# Altium schematic symbol library jlcpcb_2025_04_resistors_extended_2512.schlib: 2667 symbols (part 4 of 14) (continued)
## AC2512JK-0756KL
designator R?  Resistance: 56kΩ  (hidden comment: *)
Resistor, 56kΩ, ±5%, 1W, 200V, ±100ppm/℃, -55℃~+155℃, SMD 2512; Manufacturer: Uniroyal; Manufacturer Part Number: AC2512JK-0756KL; Supplier 1: LCSC; Supplier Part Number 1: C138220; JLCPCB Part Number: C138220; Power Rating: 1W; Category: Resistors; Package Size: 2512; JLCPCB Basic Part: Yes; Tolerance: ±5%; Voltage Rating: 200V; Temperature Coefficient: ±100ppm/℃; Temperature Rating: -55℃~+155℃; ComponentLink1Description: Datasheet; ComponentLink1URL: https://wmsc.lcsc.com/wmsc/upload/file/pdf/v2/lcsc/2304140030_YAGEO-AC2512JK-0756KL_C138220.pdf; ComponentLink2Description: JLCPCB Part URL; ComponentLink2URL: https://jlcpcb.com/partdetail/C138220
pins: 1, 2
1 alternate drawing of the same symbol

## AC2512JK-0768RL
designator R?  Resistance: 68Ω  (hidden comment: *)
Resistor, 68Ω, ±5%, 1W, 200V, ±100ppm/℃, -55℃~+155℃, SMD 2512; Manufacturer: Uniroyal; Manufacturer Part Number: AC2512JK-0768RL; Supplier 1: LCSC; Supplier Part Number 1: C231054; JLCPCB Part Number: C231054; Power Rating: 1W; Category: Resistors; Package Size: 2512; JLCPCB Basic Part: Yes; Tolerance: ±5%; Voltage Rating: 200V; Temperature Coefficient: ±100ppm/℃; Temperature Rating: -55℃~+155℃; ComponentLink1Description: Datasheet; ComponentLink1URL: https://wmsc.lcsc.com/wmsc/upload/file/pdf/v2/lcsc/2112131730_YAGEO-AC2512JK-0768RL_C231054.pdf; ComponentLink2Description: JLCPCB Part URL; ComponentLink2URL: https://jlcpcb.com/partdetail/C231054
pins: 1, 2
1 alternate drawing of the same symbol

## AC2512JK-07100KL
designator R?  Resistance: 100kΩ  (hidden comment: *)
Resistor, 100kΩ, ±5%, 1W, 200V, ±100ppm/℃, -55℃~+155℃, SMD 2512; Manufacturer: Uniroyal; Manufacturer Part Number: AC2512JK-07100KL; Supplier 1: LCSC; Supplier Part Number 1: C230951; JLCPCB Part Number: C230951; Power Rating: 1W; Category: Resistors; Package Size: 2512; JLCPCB Basic Part: Yes; Tolerance: ±5%; Voltage Rating: 200V; Temperature Coefficient: ±100ppm/℃; Temperature Rating: -55℃~+155℃; ComponentLink1Description: Datasheet; ComponentLink1URL: https://wmsc.lcsc.com/wmsc/upload/file/pdf/v2/lcsc/2112131730_YAGEO-AC2512JK-07100KL_C230951.pdf; ComponentLink2Description: JLCPCB Part URL; ComponentLink2URL: https://jlcpcb.com/partdetail/C230951
pins: 1, 2
1 alternate drawing of the same symbol

## AC2512JK-07100RL
designator R?  Resistance: 100Ω  (hidden comment: *)
Resistor, 100Ω, ±5%, 1W, 200V, ±100ppm/℃, -55℃~+155℃, SMD 2512; Manufacturer: Uniroyal; Manufacturer Part Number: AC2512JK-07100RL; Supplier 1: LCSC; Supplier Part Number 1: C230952; JLCPCB Part Number: C230952; Power Rating: 1W; Category: Resistors; Package Size: 2512; JLCPCB Basic Part: Yes; Tolerance: ±5%; Voltage Rating: 200V; Temperature Coefficient: ±100ppm/℃; Temperature Rating: -55℃~+155℃; ComponentLink1Description: Datasheet; ComponentLink1URL: https://wmsc.lcsc.com/wmsc/upload/file/pdf/v2/lcsc/2112131730_YAGEO-AC2512JK-07100RL_C230952.pdf; ComponentLink2Description: JLCPCB Part URL; ComponentLink2URL: https://jlcpcb.com/partdetail/C230952
pins: 1, 2
1 alternate drawing of the same symbol

## AC2512JK-07130RL
designator R?  Resistance: 130Ω  (hidden comment: *)
Resistor, 130Ω, ±5%, 1W, ±100ppm/℃, -55℃~+155℃, SMD 2512; Manufacturer: Uniroyal; Manufacturer Part Number: AC2512JK-07130RL; Supplier 1: LCSC; Supplier Part Number 1: C230964; JLCPCB Part Number: C230964; Power Rating: 1W; Category: Resistors; Package Size: 2512; JLCPCB Basic Part: Yes; Tolerance: ±5%; Temperature Coefficient: ±100ppm/℃; Temperature Rating: -55℃~+155℃; ComponentLink1Description: Datasheet; ComponentLink1URL: https://wmsc.lcsc.com/wmsc/upload/file/pdf/v2/lcsc/2111101730_YAGEO-AC2512JK-07130RL_C230964.pdf; ComponentLink2Description: JLCPCB Part URL; ComponentLink2URL: https://jlcpcb.com/partdetail/C230964
pins: 1, 2
1 alternate drawing of the same symbol

## AC2512JK-07150RL
designator R?  Resistance: 150Ω  (hidden comment: *)
Resistor, 150Ω, ±5%, 1W, 200V, ±100ppm/℃, -55℃~+155℃, SMD 2512; Manufacturer: Uniroyal; Manufacturer Part Number: AC2512JK-07150RL; Supplier 1: LCSC; Supplier Part Number 1: C230968; JLCPCB Part Number: C230968; Power Rating: 1W; Category: Resistors; Package Size: 2512; JLCPCB Basic Part: Yes; Tolerance: ±5%; Voltage Rating: 200V; Temperature Coefficient: ±100ppm/℃; Temperature Rating: -55℃~+155℃; ComponentLink1Description: Datasheet; ComponentLink1URL: https://wmsc.lcsc.com/wmsc/upload/file/pdf/v2/lcsc/2111241830_YAGEO-AC2512JK-07150RL_C230968.pdf; ComponentLink2Description: JLCPCB Part URL; ComponentLink2URL: https://jlcpcb.com/partdetail/C230968
pins: 1, 2
1 alternate drawing of the same symbol

## AC2512JK-07160RL
designator R?  Resistance: 160Ω  (hidden comment: *)
Resistor, 160Ω, ±5%, 1W, ±100ppm/℃, -55℃~+155℃, SMD 2512; Manufacturer: Uniroyal; Manufacturer Part Number: AC2512JK-07160RL; Supplier 1: LCSC; Supplier Part Number 1: C230971; JLCPCB Part Number: C230971; Power Rating: 1W; Category: Resistors; Package Size: 2512; JLCPCB Basic Part: Yes; Tolerance: ±5%; Temperature Coefficient: ±100ppm/℃; Temperature Rating: -55℃~+155℃; ComponentLink1Description: Datasheet; ComponentLink1URL: https://wmsc.lcsc.com/wmsc/upload/file/pdf/v2/lcsc/2112291730_YAGEO-AC2512JK-07160RL_C230971.pdf; ComponentLink2Description: JLCPCB Part URL; ComponentLink2URL: https://jlcpcb.com/partdetail/C230971
pins: 1, 2
1 alternate drawing of the same symbol

## AC2512JK-07200RL
designator R?  Resistance: 200Ω  (hidden comment: *)
Resistor, 200Ω, ±5%, 1W, ±100ppm/℃, -55℃~+155℃, SMD 2512; Manufacturer: Uniroyal; Manufacturer Part Number: AC2512JK-07200RL; Supplier 1: LCSC; Supplier Part Number 1: C230993; JLCPCB Part Number: C230993; Power Rating: 1W; Category: Resistors; Package Size: 2512; JLCPCB Basic Part: Yes; Tolerance: ±5%; Temperature Coefficient: ±100ppm/℃; Temperature Rating: -55℃~+155℃; ComponentLink1Description: Datasheet; ComponentLink1URL: https://wmsc.lcsc.com/wmsc/upload/file/pdf/v2/lcsc/2112171030_YAGEO-AC2512JK-07200RL_C230993.pdf; ComponentLink2Description: JLCPCB Part URL; ComponentLink2URL: https://jlcpcb.com/partdetail/C230993
pins: 1, 2
1 alternate drawing of the same symbol

## AC2512JK-07300KL
designator R?  Resistance: 300kΩ  (hidden comment: *)
Resistor, 300kΩ, ±5%, 1W, ±100ppm/℃, -55℃~+155℃, SMD 2512; Manufacturer: Uniroyal; Manufacturer Part Number: AC2512JK-07300KL; Supplier 1: LCSC; Supplier Part Number 1: C231012; JLCPCB Part Number: C231012; Power Rating: 1W; Category: Resistors; Package Size: 2512; JLCPCB Basic Part: Yes; Tolerance: ±5%; Temperature Coefficient: ±100ppm/℃; Temperature Rating: -55℃~+155℃; ComponentLink1Description: Datasheet; ComponentLink1URL: https://wmsc.lcsc.com/wmsc/upload/file/pdf/v2/lcsc/2204251545_YAGEO-AC2512JK-07300KL_C231012.pdf; ComponentLink2Description: JLCPCB Part URL; ComponentLink2URL: https://jlcpcb.com/partdetail/C231012
pins: 1, 2
1 alternate drawing of the same symbol

## AC2512JK-07300RL
designator R?  Resistance: 300Ω  (hidden comment: *)
Resistor, 300Ω, ±5%, 1W, 200V, ±100ppm/℃, -55℃~+155℃, SMD 2512; Manufacturer: Uniroyal; Manufacturer Part Number: AC2512JK-07300RL; Supplier 1: LCSC; Supplier Part Number 1: C231013; JLCPCB Part Number: C231013; Power Rating: 1W; Category: Resistors; Package Size: 2512; JLCPCB Basic Part: Yes; Tolerance: ±5%; Voltage Rating: 200V; Temperature Coefficient: ±100ppm/℃; Temperature Rating: -55℃~+155℃; ComponentLink1Description: Datasheet; ComponentLink1URL: https://wmsc.lcsc.com/wmsc/upload/file/pdf/v2/lcsc/2202211530_YAGEO-AC2512JK-07300RL_C231013.pdf; ComponentLink2Description: JLCPCB Part URL; ComponentLink2URL: https://jlcpcb.com/partdetail/C231013
pins: 1, 2
1 alternate drawing of the same symbol

## AC2512JK-07330RL
designator R?  Resistance: 330Ω  (hidden comment: *)
Resistor, 330Ω, ±5%, 1W, 200V, ±100ppm/℃, -55℃~+155℃, SMD 2512; Manufacturer: Uniroyal; Manufacturer Part Number: AC2512JK-07330RL; Supplier 1: LCSC; Supplier Part Number 1: C144426; JLCPCB Part Number: C144426; Power Rating: 1W; Category: Resistors; Package Size: 2512; JLCPCB Basic Part: Yes; Tolerance: ±5%; Voltage Rating: 200V; Temperature Coefficient: ±100ppm/℃; Temperature Rating: -55℃~+155℃; ComponentLink1Description: Datasheet; ComponentLink1URL: https://wmsc.lcsc.com/wmsc/upload/file/pdf/v2/lcsc/2304140030_YAGEO-AC2512JK-07330RL_C144426.pdf; ComponentLink2Description: JLCPCB Part URL; ComponentLink2URL: https://jlcpcb.com/partdetail/C144426
pins: 1, 2
1 alternate drawing of the same symbol

## AECR2512F1K00K9
designator R?  Resistance: 1kΩ  (hidden comment: *)
Resistor, 1kΩ, ±1%, 1W, 200V, ±100ppm/℃, -55℃~+125℃, SMD 2512; Manufacturer: Uniroyal; Manufacturer Part Number: AECR2512F1K00K9; Supplier 1: LCSC; Supplier Part Number 1: C328413; JLCPCB Part Number: C328413; Power Rating: 1W; Category: Resistors; Package Size: 2512; JLCPCB Basic Part: Yes; Tolerance: ±1%; Voltage Rating: 200V; Temperature Coefficient: ±100ppm/℃; Temperature Rating: -55℃~+125℃; ComponentLink1Description: Datasheet; ComponentLink1URL: https://wmsc.lcsc.com/wmsc/upload/file/pdf/v2/lcsc/2304140030_RESI-AECR2512F1K00K9_C328413.pdf; ComponentLink2Description: JLCPCB Part URL; ComponentLink2URL: https://jlcpcb.com/partdetail/C328413
pins: 1, 2
1 alternate drawing of the same symbol

## AECR2512F1R00T9
designator R?  Resistance: 1Ω  (hidden comment: *)
Resistor, 1Ω, ±1%, 1W, 200V, ±250ppm/℃, -55℃~+125℃, SMD 2512; Manufacturer: Uniroyal; Manufacturer Part Number: AECR2512F1R00T9; Supplier 1: LCSC; Supplier Part Number 1: C328414; JLCPCB Part Number: C328414; Power Rating: 1W; Category: Resistors; Package Size: 2512; JLCPCB Basic Part: Yes; Tolerance: ±1%; Voltage Rating: 200V; Temperature Coefficient: ±250ppm/℃; Temperature Rating: -55℃~+125℃; ComponentLink1Description: Datasheet; ComponentLink1URL: https://wmsc.lcsc.com/wmsc/upload/file/pdf/v2/lcsc/2304140030_RESI-AECR2512F1R00T9_C328414.pdf; ComponentLink2Description: JLCPCB Part URL; ComponentLink2URL: https://jlcpcb.com/partdetail/C328414
pins: 1, 2
1 alternate drawing of the same symbol

## AECR2512F2R00S9
designator R?  Resistance: 2Ω  (hidden comment: *)
Resistor, 2Ω, ±1%, 1W, ±250ppm/℃, SMD 2512; Manufacturer: Uniroyal; Manufacturer Part Number: AECR2512F2R00S9; Supplier 1: LCSC; Supplier Part Number 1: C2849033; JLCPCB Part Number: C2849033; Power Rating: 1W; Category: Resistors; Package Size: 2512; JLCPCB Basic Part: Yes; Tolerance: ±1%; Temperature Coefficient: ±250ppm/℃; ComponentLink1Description: Datasheet; ComponentLink1URL: https://wmsc.lcsc.com/wmsc/upload/file/pdf/v2/lcsc/2311171200_RESI-AECR2512F2R00S9_C2849033.pdf; ComponentLink2Description: JLCPCB Part URL; ComponentLink2URL: https://jlcpcb.com/partdetail/C2849033
pins: 1, 2
1 alternate drawing of the same symbol

## AECR2512F10R0K9
designator R?  Resistance: 10Ω  (hidden comment: *)
Resistor, 10Ω, ±1%, 1W, 200V, ±100ppm/℃, -55℃~+125℃, SMD 2512; Manufacturer: Uniroyal; Manufacturer Part Number: AECR2512F10R0K9; Supplier 1: LCSC; Supplier Part Number 1: C328412; JLCPCB Part Number: C328412; Power Rating: 1W; Category: Resistors; Package Size: 2512; JLCPCB Basic Part: Yes; Tolerance: ±1%; Voltage Rating: 200V; Temperature Coefficient: ±100ppm/℃; Temperature Rating: -55℃~+125℃; ComponentLink1Description: Datasheet; ComponentLink1URL: https://wmsc.lcsc.com/wmsc/upload/file/pdf/v2/lcsc/2304140030_RESI-AECR2512F10R0K9_C328412.pdf; ComponentLink2Description: JLCPCB Part URL; ComponentLink2URL: https://jlcpcb.com/partdetail/C328412
pins: 1, 2
1 alternate drawing of the same symbol

## AECR2512F100KK9
designator R?  Resistance: 100kΩ  (hidden comment: *)
Resistor, 100kΩ, ±1%, 1W, 200V, ±100ppm/℃, -55℃~+125℃, SMD 2512; Manufacturer: Uniroyal; Manufacturer Part Number: AECR2512F100KK9; Supplier 1: LCSC; Supplier Part Number 1: C351749; JLCPCB Part Number: C351749; Power Rating: 1W; Category: Resistors; Package Size: 2512; JLCPCB Basic Part: Yes; Tolerance: ±1%; Voltage Rating: 200V; Temperature Coefficient: ±100ppm/℃; Temperature Rating: -55℃~+125℃; ComponentLink1Description: Datasheet; ComponentLink1URL: https://wmsc.lcsc.com/wmsc/upload/file/pdf/v2/lcsc/2304140030_RESI-AECR2512F100KK9_C351749.pdf; ComponentLink2Description: JLCPCB Part URL; ComponentLink2URL: https://jlcpcb.com/partdetail/C351749
pins: 1, 2
1 alternate drawing of the same symbol

## AECR2512F100RK9
designator R?  Resistance: 100Ω  (hidden comment: *)
Resistor, 100Ω, ±1%, 1W, 200V, ±100ppm/℃, -55℃~+125℃, SMD 2512; Manufacturer: Uniroyal; Manufacturer Part Number: AECR2512F100RK9; Supplier 1: LCSC; Supplier Part Number 1: C328411; JLCPCB Part Number: C328411; Power Rating: 1W; Category: Resistors; Package Size: 2512; JLCPCB Basic Part: Yes; Tolerance: ±1%; Voltage Rating: 200V; Temperature Coefficient: ±100ppm/℃; Temperature Rating: -55℃~+125℃; ComponentLink1Description: Datasheet; ComponentLink1URL: https://wmsc.lcsc.com/wmsc/upload/file/pdf/v2/lcsc/2304140030_RESI-AECR2512F100RK9_C328411.pdf; ComponentLink2Description: JLCPCB Part URL; ComponentLink2URL: https://jlcpcb.com/partdetail/C328411
pins: 1, 2
1 alternate drawing of the same symbol

## AECR2512F200KK9
designator R?  Resistance: 200kΩ  (hidden comment: *)
Resistor, 200kΩ, ±1%, 1W, 200V, ±100ppm/℃, -55℃~+125℃, SMD 2512; Manufacturer: Uniroyal; Manufacturer Part Number: AECR2512F200KK9; Supplier 1: LCSC; Supplier Part Number 1: C351739; JLCPCB Part Number: C351739; Power Rating: 1W; Category: Resistors; Package Size: 2512; JLCPCB Basic Part: Yes; Tolerance: ±1%; Voltage Rating: 200V; Temperature Coefficient: ±100ppm/℃; Temperature Rating: -55℃~+125℃; ComponentLink1Description: Datasheet; ComponentLink1URL: https://wmsc.lcsc.com/wmsc/upload/file/pdf/v2/lcsc/2304140030_RESI-AECR2512F200KK9_C351739.pdf; ComponentLink2Description: JLCPCB Part URL; ComponentLink2URL: https://jlcpcb.com/partdetail/C351739
pins: 1, 2
1 alternate drawing of the same symbol

## AR12DTD2493
designator R?  Resistance: 249kΩ  (hidden comment: *)
Resistor, 249kΩ, ±0.5%, ±50ppm/℃, SMD 2512; Manufacturer: Uniroyal; Manufacturer Part Number: AR12DTD2493; Supplier 1: LCSC; Supplier Part Number 1: C3015195; JLCPCB Part Number: C3015195; Category: Resistors; Package Size: 2512; JLCPCB Basic Part: Yes; Tolerance: ±0.5%; Temperature Coefficient: ±50ppm/℃; ComponentLink1Description: Datasheet; ComponentLink1URL: https://wmsc.lcsc.com/wmsc/upload/file/pdf/v2/lcsc/2205121730_Viking-Tech-AR12DTD2493_C3015195.pdf; ComponentLink2Description: JLCPCB Part URL; ComponentLink2URL: https://jlcpcb.com/partdetail/C3015195
pins: 1, 2
1 alternate drawing of the same symbol

## AS122WJ0101T4E
designator R?  Resistance: 100Ω  (hidden comment: *)
Resistor, 100Ω, ±5%, 2W, 500V, -55℃~+155℃, SMD 2512; Manufacturer: Uniroyal; Manufacturer Part Number: AS122WJ0101T4E; Supplier 1: LCSC; Supplier Part Number 1: C2765606; JLCPCB Part Number: C2765606; Power Rating: 2W; Category: Resistors; Package Size: 2512; JLCPCB Basic Part: Yes; Tolerance: ±5%; Voltage Rating: 500V; Temperature Rating: -55℃~+155℃; ComponentLink1Description: Datasheet; ComponentLink1URL: https://wmsc.lcsc.com/wmsc/upload/file/pdf/v2/lcsc/2304140030_UNI-ROYAL-Uniroyal-Elec-AS122WJ0101T4E_C2765606.pdf; ComponentLink2Description: JLCPCB Part URL; ComponentLink2URL: https://jlcpcb.com/partdetail/C2765606
pins: 1, 2
1 alternate drawing of the same symbol

## AS122WJ0201T4E
designator R?  Resistance: 200Ω  (hidden comment: *)
Resistor, 200Ω, ±5%, 2W, 500V, -55℃~+155℃, SMD 2512; Manufacturer: Uniroyal; Manufacturer Part Number: AS122WJ0201T4E; Supplier 1: LCSC; Supplier Part Number 1: C2770484; JLCPCB Part Number: C2770484; Power Rating: 2W; Category: Resistors; Package Size: 2512; JLCPCB Basic Part: Yes; Tolerance: ±5%; Voltage Rating: 500V; Temperature Rating: -55℃~+155℃; ComponentLink1Description: Datasheet; ComponentLink1URL: https://wmsc.lcsc.com/wmsc/upload/file/pdf/v2/lcsc/2304140030_UNI-ROYAL-Uniroyal-Elec-AS122WJ0201T4E_C2770484.pdf; ComponentLink2Description: JLCPCB Part URL; ComponentLink2URL: https://jlcpcb.com/partdetail/C2770484
pins: 1, 2
1 alternate drawing of the same symbol

## AS122WJ0221T4E
designator R?  Resistance: 220Ω  (hidden comment: *)
Resistor, 220Ω, ±5%, 2W, 500V, -55℃~+155℃, SMD 2512; Manufacturer: Uniroyal; Manufacturer Part Number: AS122WJ0221T4E; Supplier 1: LCSC; Supplier Part Number 1: C965941; JLCPCB Part Number: C965941; Power Rating: 2W; Category: Resistors; Package Size: 2512; JLCPCB Basic Part: Yes; Tolerance: ±5%; Voltage Rating: 500V; Temperature Rating: -55℃~+155℃; ComponentLink1Description: Datasheet; ComponentLink1URL: https://wmsc.lcsc.com/wmsc/upload/file/pdf/v2/lcsc/2304140030_UNI-ROYAL-Uniroyal-Elec-AS122WJ0221T4E_C965941.pdf; ComponentLink2Description: JLCPCB Part URL; ComponentLink2URL: https://jlcpcb.com/partdetail/C965941
pins: 1, 2
1 alternate drawing of the same symbol

## AS122WJ0470T4E
designator R?  Resistance: 47Ω  (hidden comment: *)
Resistor, 47Ω, ±5%, 2W, 500V, ±100ppm/℃, -55℃~+155℃, SMD 2512; Manufacturer: Uniroyal; Manufacturer Part Number: AS122WJ0470T4E; Supplier 1: LCSC; Supplier Part Number 1: C2765607; JLCPCB Part Number: C2765607; Power Rating: 2W; Category: Resistors; Package Size: 2512; JLCPCB Basic Part: Yes; Tolerance: ±5%; Voltage Rating: 500V; Temperature Coefficient: ±100ppm/℃; Temperature Rating: -55℃~+155℃; ComponentLink1Description: Datasheet; ComponentLink1URL: https://wmsc.lcsc.com/wmsc/upload/file/pdf/v2/lcsc/2304140030_UNI-ROYAL-Uniroyal-Elec-AS122WJ0470T4E_C2765607.pdf; ComponentLink2Description: JLCPCB Part URL; ComponentLink2URL: https://jlcpcb.com/partdetail/C2765607
pins: 1, 2
1 alternate drawing of the same symbol

## AS122WJ0511T4E
designator R?  Resistance: 510Ω  (hidden comment: *)
Resistor, 510Ω, ±5%, 2W, 500V, ±100ppm/℃, -55℃~+155℃, SMD 2512; Manufacturer: Uniroyal; Manufacturer Part Number: AS122WJ0511T4E; Supplier 1: LCSC; Supplier Part Number 1: C2765608; JLCPCB Part Number: C2765608; Power Rating: 2W; Category: Resistors; Package Size: 2512; JLCPCB Basic Part: Yes; Tolerance: ±5%; Voltage Rating: 500V; Temperature Coefficient: ±100ppm/℃; Temperature Rating: -55℃~+155℃; ComponentLink1Description: Datasheet; ComponentLink1URL: https://wmsc.lcsc.com/wmsc/upload/file/pdf/v2/lcsc/2304140030_UNI-ROYAL-Uniroyal-Elec-AS122WJ0511T4E_C2765608.pdf; ComponentLink2Description: JLCPCB Part URL; ComponentLink2URL: https://jlcpcb.com/partdetail/C2765608
pins: 1, 2
1 alternate drawing of the same symbol

## AS2512J2K00E04Z
designator R?  Resistance: 2kΩ  (hidden comment: *)
Resistor, 2kΩ, ±10%, 1.5W, ±150ppm/℃, SMD 2512; Manufacturer: Uniroyal; Manufacturer Part Number: AS2512J2K00E04Z; Supplier 1: LCSC; Supplier Part Number 1: C881282; JLCPCB Part Number: C881282; Power Rating: 1.5W; Category: Resistors; Package Size: 2512; JLCPCB Basic Part: Yes; Tolerance: ±10%; Temperature Coefficient: ±150ppm/℃; ComponentLink1Description: Datasheet; ComponentLink1URL: https://wmsc.lcsc.com/wmsc/upload/file/pdf/v2/lcsc/2010191906_Ever-Ohms-Tech-AS2512J2K00E04Z_C881282.pdf; ComponentLink2Description: JLCPCB Part URL; ComponentLink2URL: https://jlcpcb.com/partdetail/C881282
pins: 1, 2
1 alternate drawing of the same symbol

## CQ121WF100KT4E
designator R?  Resistance: 1Ω  (hidden comment: *)
Resistor, 1Ω, ±1%, 1W, 200V, ±200ppm/℃, -55℃~+155℃, SMD 2512; Manufacturer: Uniroyal; Manufacturer Part Number: CQ121WF100KT4E; Supplier 1: LCSC; Supplier Part Number 1: C2771582; JLCPCB Part Number: C2771582; Power Rating: 1W; Category: Resistors; Package Size: 2512; JLCPCB Basic Part: Yes; Tolerance: ±1%; Voltage Rating: 200V; Temperature Coefficient: ±200ppm/℃; Temperature Rating: -55℃~+155℃; ComponentLink1Description: Datasheet; ComponentLink1URL: https://wmsc.lcsc.com/wmsc/upload/file/pdf/v2/lcsc/2304140030_UNI-ROYAL-Uniroyal-Elec-CQ121WF100KT4E_C2771582.pdf; ComponentLink2Description: JLCPCB Part URL; ComponentLink2URL: https://jlcpcb.com/partdetail/C2771582
pins: 1, 2
1 alternate drawing of the same symbol

## CQ121WF330JT4E
designator R?  Resistance: 33Ω  (hidden comment: *)
Resistor, 33Ω, ±1%, 1W, ±100ppm/℃, SMD 2512; Manufacturer: Uniroyal; Manufacturer Part Number: CQ121WF330JT4E; Supplier 1: LCSC; Supplier Part Number 1: C966236; JLCPCB Part Number: C966236; Power Rating: 1W; Category: Resistors; Package Size: 2512; JLCPCB Basic Part: Yes; Tolerance: ±1%; Temperature Coefficient: ±100ppm/℃; ComponentLink1Description: Datasheet; ComponentLink1URL: https://wmsc.lcsc.com/wmsc/upload/file/pdf/v2/lcsc/2304140030_UNI-ROYAL-Uniroyal-Elec-CQ121WF330JT4E_C966236.pdf; ComponentLink2Description: JLCPCB Part URL; ComponentLink2URL: https://jlcpcb.com/partdetail/C966236
pins: 1, 2
1 alternate drawing of the same symbol

## CQ121WF560JT4E
designator R?  Resistance: 56Ω  (hidden comment: *)
Resistor, 56Ω, ±1%, 1W, ±100ppm/℃, SMD 2512; Manufacturer: Uniroyal; Manufacturer Part Number: CQ121WF560JT4E; Supplier 1: LCSC; Supplier Part Number 1: C966232; JLCPCB Part Number: C966232; Power Rating: 1W; Category: Resistors; Package Size: 2512; JLCPCB Basic Part: Yes; Tolerance: ±1%; Temperature Coefficient: ±100ppm/℃; ComponentLink1Description: Datasheet; ComponentLink1URL: https://wmsc.lcsc.com/wmsc/upload/file/pdf/v2/lcsc/2304140030_UNI-ROYAL-Uniroyal-Elec-CQ121WF560JT4E_C966232.pdf; ComponentLink2Description: JLCPCB Part URL; ComponentLink2URL: https://jlcpcb.com/partdetail/C966232
pins: 1, 2
1 alternate drawing of the same symbol

## CQ121WF750JT4E
designator R?  Resistance: 75Ω  (hidden comment: *)
Resistor, 75Ω, ±1%, 1W, 200V, ±100ppm/℃, -55℃~+155℃, SMD 2512; Manufacturer: Uniroyal; Manufacturer Part Number: CQ121WF750JT4E; Supplier 1: LCSC; Supplier Part Number 1: C2759538; JLCPCB Part Number: C2759538; Power Rating: 1W; Category: Resistors; Package Size: 2512; JLCPCB Basic Part: Yes; Tolerance: ±1%; Voltage Rating: 200V; Temperature Coefficient: ±100ppm/℃; Temperature Rating: -55℃~+155℃; ComponentLink1Description: Datasheet; ComponentLink1URL: https://wmsc.lcsc.com/wmsc/upload/file/pdf/v2/lcsc/2304140030_UNI-ROYAL-Uniroyal-Elec-CQ121WF750JT4E_C2759538.pdf; ComponentLink2Description: JLCPCB Part URL; ComponentLink2URL: https://jlcpcb.com/partdetail/C2759538
pins: 1, 2
1 alternate drawing of the same symbol

## CQ121WF1000T4E
designator R?  Resistance: 100Ω  (hidden comment: *)
Resistor, 100Ω, ±1%, 1W, 200V, -55℃~+155℃, SMD 2512; Manufacturer: Uniroyal; Manufacturer Part Number: CQ121WF1000T4E; Supplier 1: LCSC; Supplier Part Number 1: C2771577; JLCPCB Part Number: C2771577; Power Rating: 1W; Category: Resistors; Package Size: 2512; JLCPCB Basic Part: Yes; Tolerance: ±1%; Voltage Rating: 200V; Temperature Rating: -55℃~+155℃; ComponentLink1Description: Datasheet; ComponentLink1URL: https://wmsc.lcsc.com/wmsc/upload/file/pdf/v2/lcsc/2304140030_UNI-ROYAL-Uniroyal-Elec-CQ121WF1000T4E_C2771577.pdf; ComponentLink2Description: JLCPCB Part URL; ComponentLink2URL: https://jlcpcb.com/partdetail/C2771577
pins: 1, 2
1 alternate drawing of the same symbol

## CQ121WF1301T4E
designator R?  Resistance: 1.3kΩ  (hidden comment: *)
Resistor, 1.3kΩ, ±1%, 1W, ±100ppm/℃, SMD 2512; Manufacturer: Uniroyal; Manufacturer Part Number: CQ121WF1301T4E; Supplier 1: LCSC; Supplier Part Number 1: C966246; JLCPCB Part Number: C966246; Power Rating: 1W; Category: Resistors; Package Size: 2512; JLCPCB Basic Part: Yes; Tolerance: ±1%; Temperature Coefficient: ±100ppm/℃; ComponentLink1Description: Datasheet; ComponentLink1URL: https://wmsc.lcsc.com/wmsc/upload/file/pdf/v2/lcsc/2304140030_UNI-ROYAL-Uniroyal-Elec-CQ121WF1301T4E_C966246.pdf; ComponentLink2Description: JLCPCB Part URL; ComponentLink2URL: https://jlcpcb.com/partdetail/C966246
pins: 1, 2
1 alternate drawing of the same symbol

## CQ121WF1803T4E
designator R?  Resistance: 180kΩ  (hidden comment: *)
Resistor, 180kΩ, ±1%, 1W, ±100ppm/℃, SMD 2512; Manufacturer: Uniroyal; Manufacturer Part Number: CQ121WF1803T4E; Supplier 1: LCSC; Supplier Part Number 1: C966244; JLCPCB Part Number: C966244; Power Rating: 1W; Category: Resistors; Package Size: 2512; JLCPCB Basic Part: Yes; Tolerance: ±1%; Temperature Coefficient: ±100ppm/℃; ComponentLink1Description: Datasheet; ComponentLink1URL: https://wmsc.lcsc.com/wmsc/upload/file/pdf/v2/lcsc/2304140030_UNI-ROYAL-Uniroyal-Elec-CQ121WF1803T4E_C966244.pdf; ComponentLink2Description: JLCPCB Part URL; ComponentLink2URL: https://jlcpcb.com/partdetail/C966244
pins: 1, 2
1 alternate drawing of the same symbol

## CQ121WF3303T4E
designator R?  Resistance: 330kΩ  (hidden comment: *)
Resistor, 330kΩ, ±1%, 1W, ±100ppm/℃, SMD 2512; Manufacturer: Uniroyal; Manufacturer Part Number: CQ121WF3303T4E; Supplier 1: LCSC; Supplier Part Number 1: C966237; JLCPCB Part Number: C966237; Power Rating: 1W; Category: Resistors; Package Size: 2512; JLCPCB Basic Part: Yes; Tolerance: ±1%; Temperature Coefficient: ±100ppm/℃; ComponentLink1Description: Datasheet; ComponentLink1URL: https://wmsc.lcsc.com/wmsc/upload/file/pdf/v2/lcsc/2304140030_UNI-ROYAL-Uniroyal-Elec-CQ121WF3303T4E_C966237.pdf; ComponentLink2Description: JLCPCB Part URL; ComponentLink2URL: https://jlcpcb.com/partdetail/C966237
pins: 1, 2
1 alternate drawing of the same symbol

## CQ121WF4120T4E
designator R?  Resistance: 412Ω  (hidden comment: *)
Resistor, 412Ω, ±1%, 1W, 200V, -55℃~+155℃, SMD 2512; Manufacturer: Uniroyal; Manufacturer Part Number: CQ121WF4120T4E; Supplier 1: LCSC; Supplier Part Number 1: C5151665; JLCPCB Part Number: C5151665; Power Rating: 1W; Category: Resistors; Package Size: 2512; JLCPCB Basic Part: Yes; Tolerance: ±1%; Voltage Rating: 200V; Temperature Rating: -55℃~+155℃; ComponentLink1Description: Datasheet; ComponentLink1URL: https://wmsc.lcsc.com/wmsc/upload/file/pdf/v2/lcsc/2210091800_UNI-ROYAL-Uniroyal-Elec-CQ121WF4120T4E_C5151665.pdf; ComponentLink2Description: JLCPCB Part URL; ComponentLink2URL: https://jlcpcb.com/partdetail/C5151665
pins: 1, 2
1 alternate drawing of the same symbol

## CQ121WF4300T4E
designator R?  Resistance: 430Ω  (hidden comment: *)
Resistor, 430Ω, ±1%, 1W, ±100ppm/℃, SMD 2512; Manufacturer: Uniroyal; Manufacturer Part Number: CQ121WF4300T4E; Supplier 1: LCSC; Supplier Part Number 1: C966235; JLCPCB Part Number: C966235; Power Rating: 1W; Category: Resistors; Package Size: 2512; JLCPCB Basic Part: Yes; Tolerance: ±1%; Temperature Coefficient: ±100ppm/℃; ComponentLink1Description: Datasheet; ComponentLink1URL: https://wmsc.lcsc.com/wmsc/upload/file/pdf/v2/lcsc/2304140030_UNI-ROYAL-Uniroyal-Elec-CQ121WF4300T4E_C966235.pdf; ComponentLink2Description: JLCPCB Part URL; ComponentLink2URL: https://jlcpcb.com/partdetail/C966235
pins: 1, 2
1 alternate drawing of the same symbol

## CQ121WF5600T4E
designator R?  Resistance: 560Ω  (hidden comment: *)
Resistor, 560Ω, ±1%, 1W, ±100ppm/℃, SMD 2512; Manufacturer: Uniroyal; Manufacturer Part Number: CQ121WF5600T4E; Supplier 1: LCSC; Supplier Part Number 1: C966233; JLCPCB Part Number: C966233; Power Rating: 1W; Category: Resistors; Package Size: 2512; JLCPCB Basic Part: Yes; Tolerance: ±1%; Temperature Coefficient: ±100ppm/℃; ComponentLink1Description: Datasheet; ComponentLink1URL: https://wmsc.lcsc.com/wmsc/upload/file/pdf/v2/lcsc/2304140030_UNI-ROYAL-Uniroyal-Elec-CQ121WF5600T4E_C966233.pdf; ComponentLink2Description: JLCPCB Part URL; ComponentLink2URL: https://jlcpcb.com/partdetail/C966233
pins: 1, 2
1 alternate drawing of the same symbol

## CQ121WF6201T4E
designator R?  Resistance: 6.2kΩ  (hidden comment: *)
Resistor, 6.2kΩ, ±1%, 1W, ±100ppm/℃, SMD 2512; Manufacturer: Uniroyal; Manufacturer Part Number: CQ121WF6201T4E; Supplier 1: LCSC; Supplier Part Number 1: C966231; JLCPCB Part Number: C966231; Power Rating: 1W; Category: Resistors; Package Size: 2512; JLCPCB Basic Part: Yes; Tolerance: ±1%; Temperature Coefficient: ±100ppm/℃; ComponentLink1Description: Datasheet; ComponentLink1URL: https://wmsc.lcsc.com/wmsc/upload/file/pdf/v2/lcsc/2304140030_UNI-ROYAL-Uniroyal-Elec-CQ121WF6201T4E_C966231.pdf; ComponentLink2Description: JLCPCB Part URL; ComponentLink2URL: https://jlcpcb.com/partdetail/C966231
pins: 1, 2
1 alternate drawing of the same symbol

## CQ121WF7501T4E
designator R?  Resistance: 7.5kΩ  (hidden comment: *)
Resistor, 7.5kΩ, ±1%, 1W, ±100ppm/℃, SMD 2512; Manufacturer: Uniroyal; Manufacturer Part Number: CQ121WF7501T4E; Supplier 1: LCSC; Supplier Part Number 1: C966229; JLCPCB Part Number: C966229; Power Rating: 1W; Category: Resistors; Package Size: 2512; JLCPCB Basic Part: Yes; Tolerance: ±1%; Temperature Coefficient: ±100ppm/℃; ComponentLink1Description: Datasheet; ComponentLink1URL: https://wmsc.lcsc.com/wmsc/upload/file/pdf/v2/lcsc/2304140030_UNI-ROYAL-Uniroyal-Elec-CQ121WF7501T4E_C966229.pdf; ComponentLink2Description: JLCPCB Part URL; ComponentLink2URL: https://jlcpcb.com/partdetail/C966229
pins: 1, 2
1 alternate drawing of the same symbol

## CQ121WJ0105T4E
designator R?  Resistance: 1MΩ  (hidden comment: *)
Resistor, 1MΩ, ±5%, 1W, ±100ppm/℃, SMD 2512; Manufacturer: Uniroyal; Manufacturer Part Number: CQ121WJ0105T4E; Supplier 1: LCSC; Supplier Part Number 1: C966223; JLCPCB Part Number: C966223; Power Rating: 1W; Category: Resistors; Package Size: 2512; JLCPCB Basic Part: Yes; Tolerance: ±5%; Temperature Coefficient: ±100ppm/℃; ComponentLink1Description: Datasheet; ComponentLink1URL: https://wmsc.lcsc.com/wmsc/upload/file/pdf/v2/lcsc/2304140030_UNI-ROYAL-Uniroyal-Elec-CQ121WJ0105T4E_C966223.pdf; ComponentLink2Description: JLCPCB Part URL; ComponentLink2URL: https://jlcpcb.com/partdetail/C966223
pins: 1, 2
1 alternate drawing of the same symbol

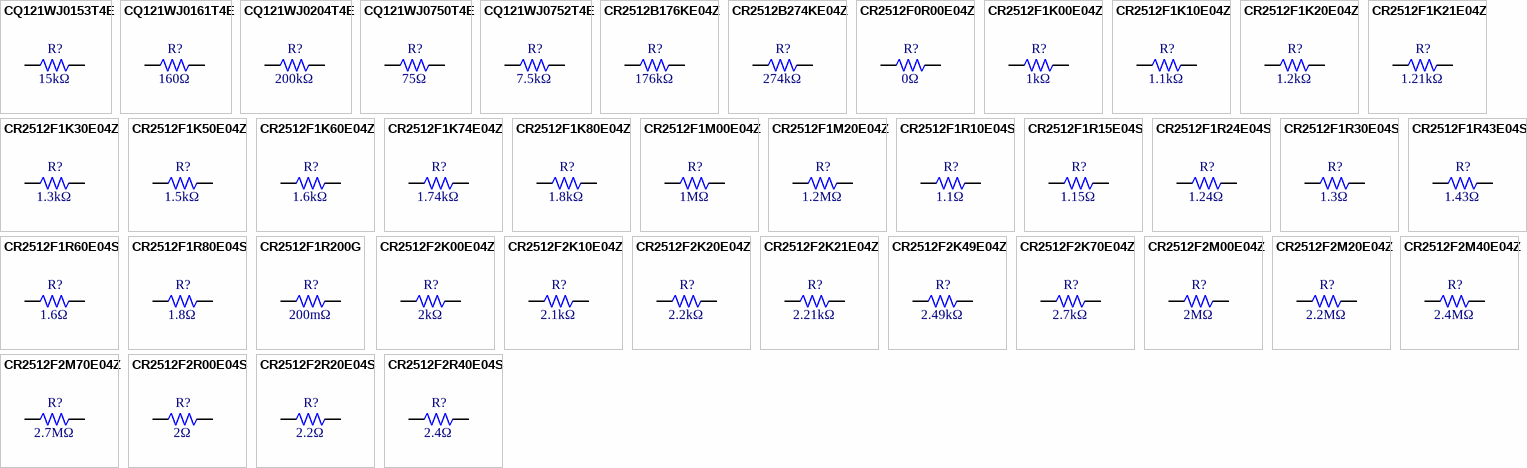
[diagram p18: symbols CQ121WJ0153T4E to CR2512F2R40E04S]

## CQ121WJ0153T4E
designator R?  Resistance: 15kΩ  (hidden comment: *)
Resistor, 15kΩ, ±5%, 1W, ±100ppm/℃, SMD 2512; Manufacturer: Uniroyal; Manufacturer Part Number: CQ121WJ0153T4E; Supplier 1: LCSC; Supplier Part Number 1: C966219; JLCPCB Part Number: C966219; Power Rating: 1W; Category: Resistors; Package Size: 2512; JLCPCB Basic Part: Yes; Tolerance: ±5%; Temperature Coefficient: ±100ppm/℃; ComponentLink1Description: Datasheet; ComponentLink1URL: https://wmsc.lcsc.com/wmsc/upload/file/pdf/v2/lcsc/2304140030_UNI-ROYAL-Uniroyal-Elec-CQ121WJ0153T4E_C966219.pdf; ComponentLink2Description: JLCPCB Part URL; ComponentLink2URL: https://jlcpcb.com/partdetail/C966219
pins: 1, 2
1 alternate drawing of the same symbol

## CQ121WJ0161T4E
designator R?  Resistance: 160Ω  (hidden comment: *)
Resistor, 160Ω, ±5%, 1W, ±100ppm/℃, SMD 2512; Manufacturer: Uniroyal; Manufacturer Part Number: CQ121WJ0161T4E; Supplier 1: LCSC; Supplier Part Number 1: C966218; JLCPCB Part Number: C966218; Power Rating: 1W; Category: Resistors; Package Size: 2512; JLCPCB Basic Part: Yes; Tolerance: ±5%; Temperature Coefficient: ±100ppm/℃; ComponentLink1Description: Datasheet; ComponentLink1URL: https://wmsc.lcsc.com/wmsc/upload/file/pdf/v2/lcsc/2304140030_UNI-ROYAL-Uniroyal-Elec-CQ121WJ0161T4E_C966218.pdf; ComponentLink2Description: JLCPCB Part URL; ComponentLink2URL: https://jlcpcb.com/partdetail/C966218
pins: 1, 2
1 alternate drawing of the same symbol

## CQ121WJ0204T4E
designator R?  Resistance: 200kΩ  (hidden comment: *)
Resistor, 200kΩ, ±5%, 1W, ±100ppm/℃, SMD 2512; Manufacturer: Uniroyal; Manufacturer Part Number: CQ121WJ0204T4E; Supplier 1: LCSC; Supplier Part Number 1: C966216; JLCPCB Part Number: C966216; Power Rating: 1W; Category: Resistors; Package Size: 2512; JLCPCB Basic Part: Yes; Tolerance: ±5%; Temperature Coefficient: ±100ppm/℃; ComponentLink1Description: Datasheet; ComponentLink1URL: https://wmsc.lcsc.com/wmsc/upload/file/pdf/v2/lcsc/2304140030_UNI-ROYAL-Uniroyal-Elec-CQ121WJ0204T4E_C966216.pdf; ComponentLink2Description: JLCPCB Part URL; ComponentLink2URL: https://jlcpcb.com/partdetail/C966216
pins: 1, 2
1 alternate drawing of the same symbol

## CQ121WJ0750T4E
designator R?  Resistance: 75Ω  (hidden comment: *)
Resistor, 75Ω, ±5%, 1W, ±100ppm/℃, SMD 2512; Manufacturer: Uniroyal; Manufacturer Part Number: CQ121WJ0750T4E; Supplier 1: LCSC; Supplier Part Number 1: C966208; JLCPCB Part Number: C966208; Power Rating: 1W; Category: Resistors; Package Size: 2512; JLCPCB Basic Part: Yes; Tolerance: ±5%; Temperature Coefficient: ±100ppm/℃; ComponentLink1Description: Datasheet; ComponentLink1URL: https://wmsc.lcsc.com/wmsc/upload/file/pdf/v2/lcsc/2304140030_UNI-ROYAL-Uniroyal-Elec-CQ121WJ0750T4E_C966208.pdf; ComponentLink2Description: JLCPCB Part URL; ComponentLink2URL: https://jlcpcb.com/partdetail/C966208
pins: 1, 2
1 alternate drawing of the same symbol

## CQ121WJ0752T4E
designator R?  Resistance: 7.5kΩ  (hidden comment: *)
Resistor, 7.5kΩ, ±5%, 1W, ±100ppm/℃, SMD 2512; Manufacturer: Uniroyal; Manufacturer Part Number: CQ121WJ0752T4E; Supplier 1: LCSC; Supplier Part Number 1: C966207; JLCPCB Part Number: C966207; Power Rating: 1W; Category: Resistors; Package Size: 2512; JLCPCB Basic Part: Yes; Tolerance: ±5%; Temperature Coefficient: ±100ppm/℃; ComponentLink1Description: Datasheet; ComponentLink1URL: https://wmsc.lcsc.com/wmsc/upload/file/pdf/v2/lcsc/2304140030_UNI-ROYAL-Uniroyal-Elec-CQ121WJ0752T4E_C966207.pdf; ComponentLink2Description: JLCPCB Part URL; ComponentLink2URL: https://jlcpcb.com/partdetail/C966207
pins: 1, 2
1 alternate drawing of the same symbol

## CR2512B176KE04Z
designator R?  Resistance: 176kΩ  (hidden comment: *)
Resistor, 176kΩ, ±0.1%, 1W, 200V, ±100ppm/℃, -55℃~+155℃, SMD 2512; Manufacturer: Uniroyal; Manufacturer Part Number: CR2512B176KE04Z; Supplier 1: LCSC; Supplier Part Number 1: C175209; JLCPCB Part Number: C175209; Power Rating: 1W; Category: Resistors; Package Size: 2512; JLCPCB Basic Part: Yes; Tolerance: ±0.1%; Voltage Rating: 200V; Temperature Coefficient: ±100ppm/℃; Temperature Rating: -55℃~+155℃; ComponentLink1Description: Datasheet; ComponentLink1URL: https://wmsc.lcsc.com/wmsc/upload/file/pdf/v2/lcsc/2304140030_Ever-Ohms-Tech-CR2512B176KE04Z_C175209.pdf; ComponentLink2Description: JLCPCB Part URL; ComponentLink2URL: https://jlcpcb.com/partdetail/C175209
pins: 1, 2
1 alternate drawing of the same symbol

## CR2512B274KE04Z
designator R?  Resistance: 274kΩ  (hidden comment: *)
Resistor, 274kΩ, ±0.1%, 1W, 200V, ±100ppm/℃, -55℃~+155℃, SMD 2512; Manufacturer: Uniroyal; Manufacturer Part Number: CR2512B274KE04Z; Supplier 1: LCSC; Supplier Part Number 1: C175210; JLCPCB Part Number: C175210; Power Rating: 1W; Category: Resistors; Package Size: 2512; JLCPCB Basic Part: Yes; Tolerance: ±0.1%; Voltage Rating: 200V; Temperature Coefficient: ±100ppm/℃; Temperature Rating: -55℃~+155℃; ComponentLink1Description: Datasheet; ComponentLink1URL: https://wmsc.lcsc.com/wmsc/upload/file/pdf/v2/lcsc/2304140030_Ever-Ohms-Tech-CR2512B274KE04Z_C175210.pdf; ComponentLink2Description: JLCPCB Part URL; ComponentLink2URL: https://jlcpcb.com/partdetail/C175210
pins: 1, 2
1 alternate drawing of the same symbol

## CR2512F0R00E04Z
designator R?  Resistance: 0Ω  (hidden comment: *)
Resistor, 0Ω, ±1%, 1W, 200V, -55℃~+155℃, SMD 2512; Manufacturer: Uniroyal; Manufacturer Part Number: CR2512F0R00E04Z; Supplier 1: LCSC; Supplier Part Number 1: C175214; JLCPCB Part Number: C175214; Power Rating: 1W; Category: Resistors; Package Size: 2512; JLCPCB Basic Part: Yes; Tolerance: ±1%; Voltage Rating: 200V; Temperature Rating: -55℃~+155℃; ComponentLink1Description: Datasheet; ComponentLink1URL: https://wmsc.lcsc.com/wmsc/upload/file/pdf/v2/lcsc/2304140030_Ever-Ohms-Tech-CR2512F0R00E04Z_C175214.pdf; ComponentLink2Description: JLCPCB Part URL; ComponentLink2URL: https://jlcpcb.com/partdetail/C175214
pins: 1, 2
1 alternate drawing of the same symbol

## CR2512F1K00E04Z
designator R?  Resistance: 1kΩ  (hidden comment: *)
Resistor, 1kΩ, ±1%, 1W, 200V, ±100ppm/℃, -55℃~+155℃, SMD 2512; Manufacturer: Uniroyal; Manufacturer Part Number: CR2512F1K00E04Z; Supplier 1: LCSC; Supplier Part Number 1: C245685; JLCPCB Part Number: C245685; Power Rating: 1W; Category: Resistors; Package Size: 2512; JLCPCB Basic Part: Yes; Tolerance: ±1%; Voltage Rating: 200V; Temperature Coefficient: ±100ppm/℃; Temperature Rating: -55℃~+155℃; ComponentLink1Description: Datasheet; ComponentLink1URL: https://wmsc.lcsc.com/wmsc/upload/file/pdf/v2/lcsc/2404011707_Ever-Ohms-Tech-CR2512F1K00E04Z_C245685.pdf; ComponentLink2Description: JLCPCB Part URL; ComponentLink2URL: https://jlcpcb.com/partdetail/C245685
pins: 1, 2
1 alternate drawing of the same symbol

## CR2512F1K10E04Z
designator R?  Resistance: 1.1kΩ  (hidden comment: *)
Resistor, 1.1kΩ, ±1%, 1W, 200V, ±100ppm/℃, -55℃~+155℃, SMD 2512; Manufacturer: Uniroyal; Manufacturer Part Number: CR2512F1K10E04Z; Supplier 1: LCSC; Supplier Part Number 1: C175321; JLCPCB Part Number: C175321; Power Rating: 1W; Category: Resistors; Package Size: 2512; JLCPCB Basic Part: Yes; Tolerance: ±1%; Voltage Rating: 200V; Temperature Coefficient: ±100ppm/℃; Temperature Rating: -55℃~+155℃; ComponentLink1Description: Datasheet; ComponentLink1URL: https://wmsc.lcsc.com/wmsc/upload/file/pdf/v2/lcsc/2304140030_Ever-Ohms-Tech-CR2512F1K10E04Z_C175321.pdf; ComponentLink2Description: JLCPCB Part URL; ComponentLink2URL: https://jlcpcb.com/partdetail/C175321
pins: 1, 2
1 alternate drawing of the same symbol

## CR2512F1K20E04Z
designator R?  Resistance: 1.2kΩ  (hidden comment: *)
Resistor, 1.2kΩ, ±1%, 1W, 200V, ±100ppm/℃, -55℃~+155℃, SMD 2512; Manufacturer: Uniroyal; Manufacturer Part Number: CR2512F1K20E04Z; Supplier 1: LCSC; Supplier Part Number 1: C175322; JLCPCB Part Number: C175322; Power Rating: 1W; Category: Resistors; Package Size: 2512; JLCPCB Basic Part: Yes; Tolerance: ±1%; Voltage Rating: 200V; Temperature Coefficient: ±100ppm/℃; Temperature Rating: -55℃~+155℃; ComponentLink1Description: Datasheet; ComponentLink1URL: https://wmsc.lcsc.com/wmsc/upload/file/pdf/v2/lcsc/2304140030_Ever-Ohms-Tech-CR2512F1K20E04Z_C175322.pdf; ComponentLink2Description: JLCPCB Part URL; ComponentLink2URL: https://jlcpcb.com/partdetail/C175322
pins: 1, 2
1 alternate drawing of the same symbol

## CR2512F1K21E04Z
designator R?  Resistance: 1.21kΩ  (hidden comment: *)
Resistor, 1.21kΩ, ±1%, 1W, 200V, ±100ppm/℃, -55℃~+155℃, SMD 2512; Manufacturer: Uniroyal; Manufacturer Part Number: CR2512F1K21E04Z; Supplier 1: LCSC; Supplier Part Number 1: C175324; JLCPCB Part Number: C175324; Power Rating: 1W; Category: Resistors; Package Size: 2512; JLCPCB Basic Part: Yes; Tolerance: ±1%; Voltage Rating: 200V; Temperature Coefficient: ±100ppm/℃; Temperature Rating: -55℃~+155℃; ComponentLink1Description: Datasheet; ComponentLink1URL: https://wmsc.lcsc.com/wmsc/upload/file/pdf/v2/lcsc/2304140030_Ever-Ohms-Tech-CR2512F1K21E04Z_C175324.pdf; ComponentLink2Description: JLCPCB Part URL; ComponentLink2URL: https://jlcpcb.com/partdetail/C175324
pins: 1, 2
1 alternate drawing of the same symbol

## CR2512F1K30E04Z
designator R?  Resistance: 1.3kΩ  (hidden comment: *)
Resistor, 1.3kΩ, ±1%, 1W, 200V, ±100ppm/℃, -55℃~+155℃, SMD 2512; Manufacturer: Uniroyal; Manufacturer Part Number: CR2512F1K30E04Z; Supplier 1: LCSC; Supplier Part Number 1: C245683; JLCPCB Part Number: C245683; Power Rating: 1W; Category: Resistors; Package Size: 2512; JLCPCB Basic Part: Yes; Tolerance: ±1%; Voltage Rating: 200V; Temperature Coefficient: ±100ppm/℃; Temperature Rating: -55℃~+155℃; ComponentLink1Description: Datasheet; ComponentLink1URL: https://wmsc.lcsc.com/wmsc/upload/file/pdf/v2/lcsc/2404011707_Ever-Ohms-Tech-CR2512F1K30E04Z_C245683.pdf; ComponentLink2Description: JLCPCB Part URL; ComponentLink2URL: https://jlcpcb.com/partdetail/C245683
pins: 1, 2
1 alternate drawing of the same symbol

## CR2512F1K50E04Z
designator R?  Resistance: 1.5kΩ  (hidden comment: *)
Resistor, 1.5kΩ, ±1%, 1W, 200V, ±100ppm/℃, -55℃~+155℃, SMD 2512; Manufacturer: Uniroyal; Manufacturer Part Number: CR2512F1K50E04Z; Supplier 1: LCSC; Supplier Part Number 1: C245684; JLCPCB Part Number: C245684; Power Rating: 1W; Category: Resistors; Package Size: 2512; JLCPCB Basic Part: Yes; Tolerance: ±1%; Voltage Rating: 200V; Temperature Coefficient: ±100ppm/℃; Temperature Rating: -55℃~+155℃; ComponentLink1Description: Datasheet; ComponentLink1URL: https://wmsc.lcsc.com/wmsc/upload/file/pdf/v2/lcsc/2404011707_Ever-Ohms-Tech-CR2512F1K50E04Z_C245684.pdf; ComponentLink2Description: JLCPCB Part URL; ComponentLink2URL: https://jlcpcb.com/partdetail/C245684
pins: 1, 2
1 alternate drawing of the same symbol

## CR2512F1K60E04Z
designator R?  Resistance: 1.6kΩ  (hidden comment: *)
Resistor, 1.6kΩ, ±1%, 1W, 200V, ±100ppm/℃, -55℃~+155℃, SMD 2512; Manufacturer: Uniroyal; Manufacturer Part Number: CR2512F1K60E04Z; Supplier 1: LCSC; Supplier Part Number 1: C175326; JLCPCB Part Number: C175326; Power Rating: 1W; Category: Resistors; Package Size: 2512; JLCPCB Basic Part: Yes; Tolerance: ±1%; Voltage Rating: 200V; Temperature Coefficient: ±100ppm/℃; Temperature Rating: -55℃~+155℃; ComponentLink1Description: Datasheet; ComponentLink1URL: https://wmsc.lcsc.com/wmsc/upload/file/pdf/v2/lcsc/2304140030_Ever-Ohms-Tech-CR2512F1K60E04Z_C175326.pdf; ComponentLink2Description: JLCPCB Part URL; ComponentLink2URL: https://jlcpcb.com/partdetail/C175326
pins: 1, 2
1 alternate drawing of the same symbol
